# Altium footprint library 4.30-KF-5.08连接器.PcbLib: 147 footprints (part 7 of 10)
Each footprint in its own frame and in the unit in brackets; x right, y up, seen from the top. Pads: shape width x height; smd on the part's side, far side on the other; paste and mask are expansions set on the pad; w line width, h text height; cw(c..) or ccw(c..) is an arc to the next point about the centre after c.
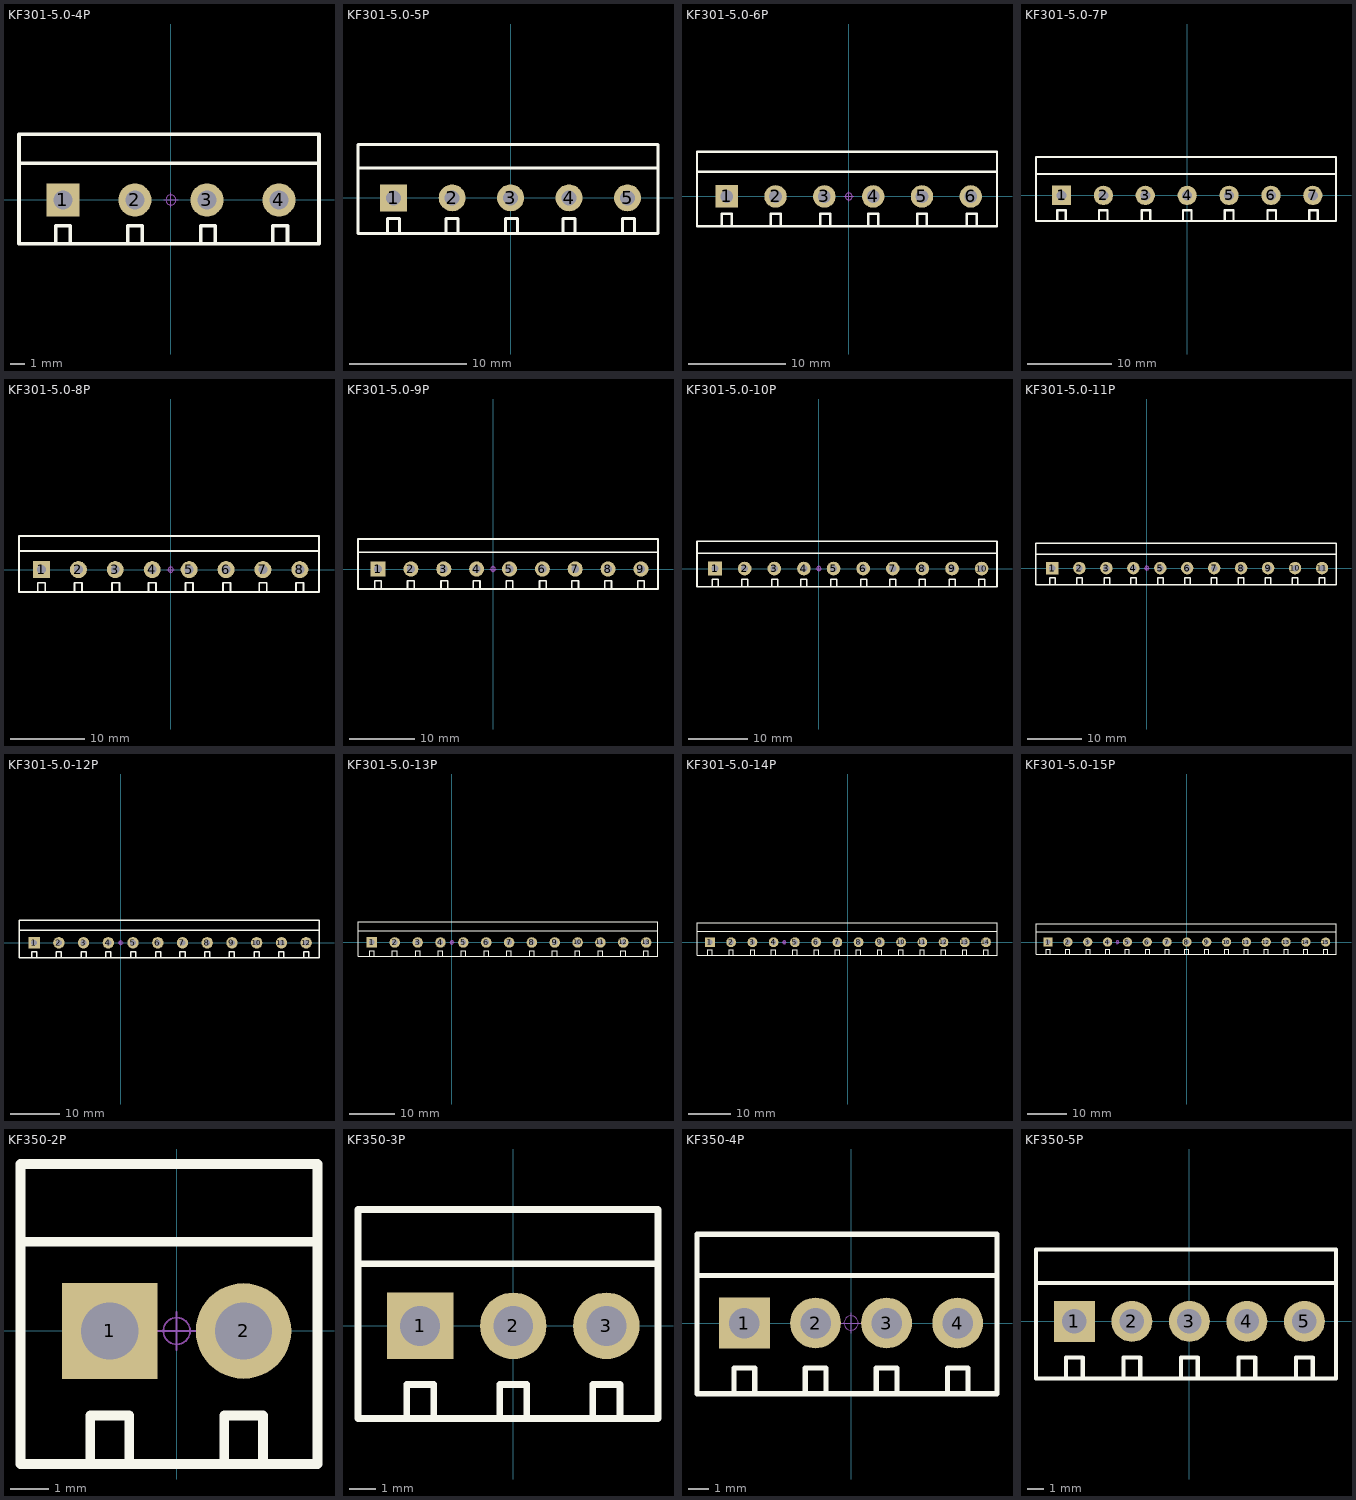
[diagram p6: the footprints below, top view; thin cyan lines are the x and y axes]

## KF301-5.0-4P [mm] "可拼接端子/6A"
pads (4):
  rect 2.3x2.3 hole 1.3: 1(-7.5,0)
  round 2.3 hole 1.3: 2(-2.5,0) 3(2.5,0) 4(7.5,0)
Top Overlay:
  lines w0.254: -10.548,2.54 10.28,2.54 ; -8.008,-3.048 -8.008,-1.778 -6.992,-1.778 -6.992,-3.048 ; -3.008,-3.048 -3.008,-1.778 -1.992,-1.778 -1.992,-3.048 ; 2.072,-3.048 2.072,-1.778 3.088,-1.778 3.088,-3.048 ; 7.072,-3.048 7.072,-1.778 8.088,-1.778 8.088,-3.048 ; -10.548,-3.048 -10.548,4.572 10.28,4.572 10.28,-3.048 -10.548,-3.048
Mechanical 15:
  circle w0.05: c0,0 r0.35
  lines w0.05: -0.5,0 0.5,0 ; 0,-0.5 0,0.5
3D body: height 3.29, standoff -10.51, extent -10.45,-3 -4.95,4.6
3D body: height 3.29, standoff -10.51, extent -5.45,-3 0.05,4.6
3D body: height 3.29, standoff -10.51, extent -0.45,-3 5.05,4.6
3D body: height 3.29, standoff -10.51, extent 4.55,-3 10.05,4.6

## KF301-5.0-5P [mm] "可拼接端子/6A"
pads (5):
  rect 2.3x2.3 hole 1.3: 1(-10,0)
  round 2.3 hole 1.3: 2(-5,0) 3(0,0) 4(5,0) 5(10,0)
Top Overlay:
  lines w0.254: -13.048,2.54 12.606,2.54 ; -10.508,-3.048 -10.508,-1.778 -9.492,-1.778 -9.492,-3.048 ; -5.508,-3.048 -5.508,-1.778 -4.492,-1.778 -4.492,-3.048 ; -0.428,-3.048 -0.428,-1.778 0.588,-1.778 0.588,-3.048 ; 4.492,-3.048 4.492,-1.778 5.508,-1.778 5.508,-3.048 ; 9.572,-3.048 9.572,-1.778 10.588,-1.778 10.588,-3.048 ; -13.048,-3.048 12.606,-3.048 12.606,4.572 -13.048,4.572 -13.048,-3.048
Mechanical 15:
  circle w0.05: c0,0 r0.35
  lines w0.05: -0.5,0 0.5,0 ; 0,-0.5 0,0.5
3D body: height 3.29, standoff -10.51, extent 7.05,-3 12.55,4.6
3D body: height 3.29, standoff -10.51, extent 2.05,-3 7.55,4.6
3D body: height 3.29, standoff -10.51, extent -2.95,-3 2.55,4.6
3D body: height 3.29, standoff -10.51, extent -7.95,-3 -2.45,4.6
3D body: height 3.29, standoff -10.51, extent -12.95,-3 -7.45,4.6

## KF301-5.0-6P [mm] "可拼接端子/6A"
pads (6):
  rect 2.3x2.3 hole 1.3: 1(-12.5,0)
  round 2.3 hole 1.3: 2(-7.5,0) 3(-2.5,0) 4(2.5,0) 5(7.5,0) 6(12.5,0)
Top Overlay:
  lines w0.254: -15.548,2.54 15.186,2.54 ; -13.008,-3.048 -13.008,-1.778 -11.992,-1.778 -11.992,-3.048 ; -8.008,-3.048 -8.008,-1.778 -6.992,-1.778 -6.992,-3.048 ; -2.928,-3.048 -2.928,-1.778 -1.912,-1.778 -1.912,-3.048 ; 1.992,-3.048 1.992,-1.778 3.008,-1.778 3.008,-3.048 ; 6.992,-3.048 6.992,-1.778 8.008,-1.778 8.008,-3.048 ; 12.072,-3.048 12.072,-1.778 13.088,-1.778 13.088,-3.048 ; -15.548,-3.048 15.186,-3.048 15.186,4.572 -15.548,4.572 -15.548,-3.048
Mechanical 15:
  circle w0.05: c0,0 r0.35
  lines w0.05: -0.5,0 0.5,0 ; 0,-0.5 0,0.5
3D body: height 3.29, standoff -10.51, extent -15.45,-3 -9.95,4.6
3D body: height 3.29, standoff -10.51, extent -10.45,-3 -4.95,4.6
3D body: height 3.29, standoff -10.51, extent -5.45,-3 0.05,4.6
3D body: height 3.29, standoff -10.51, extent -0.45,-3 5.05,4.6
3D body: height 3.29, standoff -10.51, extent 4.55,-3 10.05,4.6
3D body: height 3.29, standoff -10.51, extent 9.55,-3 15.05,4.6

## KF301-5.0-7P [mm] "可拼接端子/6A"
pads (7):
  rect 2.3x2.3 hole 1.2: 1(-15,0)
  round 2.3 hole 1.2: 2(-10,0) 3(-5,0) 4(0,0) 5(5,0) 6(10,0) 7(15,0)
Top Overlay:
  lines w0.254: -18.048,2.54 17.766,2.54 ; -15.508,-3.048 -15.508,-1.778 -14.492,-1.778 -14.492,-3.048 ; -10.508,-3.048 -10.508,-1.778 -9.492,-1.778 -9.492,-3.048 ; -5.428,-3.048 -5.428,-1.778 -4.412,-1.778 -4.412,-3.048 ; -0.508,-3.048 -0.508,-1.778 0.508,-1.778 0.508,-3.048 ; 4.492,-3.048 4.492,-1.778 5.508,-1.778 5.508,-3.048 ; 9.572,-3.048 9.572,-1.778 10.588,-1.778 10.588,-3.048 ; 14.572,-3.048 14.572,-1.778 15.588,-1.778 15.588,-3.048 ; -18.048,-3.048 17.766,-3.048 17.766,4.572 -18.048,4.572 -18.048,-3.048
Mechanical 15:
  circle w0.05: c0,0 r0.35
  lines w0.05: -0.5,0 0.5,0 ; 0,-0.5 0,0.5
3D body: height 3.29, standoff -10.51, extent -17.95,-3 -12.45,4.6
3D body: height 3.29, standoff -10.51, extent -12.95,-3 -7.45,4.6
3D body: height 3.29, standoff -10.51, extent -7.95,-3 -2.45,4.6
3D body: height 3.29, standoff -10.51, extent -2.95,-3 2.55,4.6
3D body: height 3.29, standoff -10.51, extent 2.05,-3 7.55,4.6
3D body: height 3.29, standoff -10.51, extent 7.05,-3 12.55,4.6
3D body: height 3.29, standoff -10.51, extent 12.05,-3 17.55,4.6

## KF301-5.0-8P [mm] "可拼接端子/6A"
pads (8):
  rect 2.3x2.3 hole 1.2: 1(-17.5,0)
  round 2.3 hole 1.2: 2(-12.5,0) 3(-7.5,0) 4(-2.5,0) 5(2.5,0) 6(7.5,0) 7(12.5,0) 8(17.5,0)
Top Overlay:
  lines w0.254: -20.548,2.54 20.092,2.54 ; -18.008,-3.048 -18.008,-1.778 -16.992,-1.778 -16.992,-3.048 ; -13.008,-3.048 -13.008,-1.778 -11.992,-1.778 -11.992,-3.048 ; -7.928,-3.048 -7.928,-1.778 -6.912,-1.778 -6.912,-3.048 ; -3.008,-3.048 -3.008,-1.778 -1.992,-1.778 -1.992,-3.048 ; 1.992,-3.048 1.992,-1.778 3.008,-1.778 3.008,-3.048 ; 7.072,-3.048 7.072,-1.778 8.088,-1.778 8.088,-3.048 ; 11.992,-3.048 11.992,-1.778 13.008,-1.778 13.008,-3.048 ; 16.992,-3.048 16.992,-1.778 18.008,-1.778 18.008,-3.048 ; -20.548,-3.048 -20.548,4.572 20.092,4.572 20.092,-3.048 -20.548,-3.048
Mechanical 15:
  circle w0.05: c0,0 r0.35
  lines w0.05: -0.5,0 0.5,0 ; 0,-0.5 0,0.5
3D body: height 3.29, standoff -10.51, extent -20.45,-3 -14.95,4.6
3D body: height 3.29, standoff -10.51, extent -15.45,-3 -9.95,4.6
3D body: height 3.29, standoff -10.51, extent -10.45,-3 -4.95,4.6
3D body: height 3.29, standoff -10.51, extent -5.45,-3 0.05,4.6
3D body: height 3.29, standoff -10.51, extent -0.45,-3 5.05,4.6
3D body: height 3.29, standoff -10.51, extent 4.55,-3 10.05,4.6
3D body: height 3.29, standoff -10.51, extent 9.55,-3 15.05,4.6
3D body: height 3.29, standoff -10.51, extent 14.55,-3 20.05,4.6

## KF301-5.0-9P [mm] "可拼接端子/6A"
pads (9):
  rect 2.3x2.3 hole 1.2: 1(-17.5,0)
  round 2.3 hole 1.2: 2(-12.5,0) 3(-7.5,0) 4(-2.5,0) 5(2.5,0) 6(7.5,0) 7(12.5,0) 8(17.5,0) 9(22.5,0)
Top Overlay:
  lines w0.254: -20.548,2.54 20.092,2.54 25.052,2.54 ; -18.008,-3.048 -18.008,-1.778 -16.992,-1.778 -16.992,-3.048 ; -13.008,-3.048 -13.008,-1.778 -11.992,-1.778 -11.992,-3.048 ; -7.928,-3.048 -7.928,-1.778 -6.912,-1.778 -6.912,-3.048 ; -3.008,-3.048 -3.008,-1.778 -1.992,-1.778 -1.992,-3.048 ; 1.992,-3.048 1.992,-1.778 3.008,-1.778 3.008,-3.048 ; 7.072,-3.048 7.072,-1.778 8.088,-1.778 8.088,-3.048 ; 11.992,-3.048 11.992,-1.778 13.008,-1.778 13.008,-3.048 ; 16.992,-3.048 16.992,-1.778 18.008,-1.778 18.008,-3.048 ; 21.992,-3.048 21.992,-1.778 23.008,-1.778 23.008,-3.048 ; -20.548,-3.048 20.092,-3.048 25.092,-3.048 25.092,4.572 20.092,4.572 -20.548,4.572 -20.548,-3.048
Mechanical 15:
  circle w0.05: c0,0 r0.35
  lines w0.05: -0.5,0 0.5,0 ; 0,-0.5 0,0.5
3D body: height 3.29, standoff -10.51, extent -20.45,-3 -14.95,4.6
3D body: height 3.29, standoff -10.51, extent -15.45,-3 -9.95,4.6
3D body: height 3.29, standoff -10.51, extent -10.45,-3 -4.95,4.6
3D body: height 3.29, standoff -10.51, extent -5.45,-3 0.05,4.6
3D body: height 3.29, standoff -10.51, extent -0.45,-3 5.05,4.6
3D body: height 3.29, standoff -10.51, extent 4.55,-3 10.05,4.6
3D body: height 3.29, standoff -10.51, extent 9.55,-3 15.05,4.6
3D body: height 3.29, standoff -10.51, extent 14.55,-3 20.05,4.6
3D body: height 3.29, standoff -10.51, extent 19.55,-3 25.05,4.6

## KF301-5.0-10P [mm] "可拼接端子/6A"
pads (10):
  rect 2.3x2.3 hole 1.2: 1(-17.5,0)
  round 2.3 hole 1.2: 2(-12.5,0) 3(-7.5,0) 4(-2.5,0) 5(2.5,0) 6(7.5,0) 7(12.5,0) 8(17.5,0) 9(22.5,0) 10(27.5,0)
Top Overlay:
  lines w0.254: -20.548,2.54 20.092,2.54 25.052,2.54 ; -18.008,-3.048 -18.008,-1.778 -16.992,-1.778 -16.992,-3.048 ; -13.008,-3.048 -13.008,-1.778 -11.992,-1.778 -11.992,-3.048 ; -7.928,-3.048 -7.928,-1.778 -6.912,-1.778 -6.912,-3.048 ; -3.008,-3.048 -3.008,-1.778 -1.992,-1.778 -1.992,-3.048 ; 1.992,-3.048 1.992,-1.778 3.008,-1.778 3.008,-3.048 ; 7.072,-3.048 7.072,-1.778 8.088,-1.778 8.088,-3.048 ; 11.992,-3.048 11.992,-1.778 13.008,-1.778 13.008,-3.048 ; 16.992,-3.048 16.992,-1.778 18.008,-1.778 18.008,-3.048 ; 21.992,-3.048 21.992,-1.778 23.008,-1.778 23.008,-3.048 ; 25.092,2.54 30.052,2.54 ; 26.992,-3.048 26.992,-1.778 28.008,-1.778 28.008,-3.048 ; -20.548,-3.048 20.092,-3.048 25.092,-3.048 30.092,-3.048 30.092,4.572 25.092,4.572 20.092,4.572 -20.548,4.572 -20.548,-3.048
Mechanical 15:
  circle w0.05: c0,0 r0.35
  lines w0.05: -0.5,0 0.5,0 ; 0,-0.5 0,0.5
3D body: height 3.29, standoff -10.51, extent -20.45,-3 -14.95,4.6
3D body: height 3.29, standoff -10.51, extent -15.45,-3 -9.95,4.6
3D body: height 3.29, standoff -10.51, extent -10.45,-3 -4.95,4.6
3D body: height 3.29, standoff -10.51, extent -5.45,-3 0.05,4.6
3D body: height 3.29, standoff -10.51, extent -0.45,-3 5.05,4.6
3D body: height 3.29, standoff -10.51, extent 4.55,-3 10.05,4.6
3D body: height 3.29, standoff -10.51, extent 9.55,-3 15.05,4.6
3D body: height 3.29, standoff -10.51, extent 14.55,-3 20.05,4.6
3D body: height 3.29, standoff -10.51, extent 19.55,-3 25.05,4.6
3D body: height 3.29, standoff -10.51, extent 24.55,-3 30.05,4.6

## KF301-5.0-11P [mm] "可拼接端子/6A"
pads (11):
  rect 2.3x2.3 hole 1.2: 1(-17.5,0)
  round 2.3 hole 1.2: 2(-12.5,0) 3(-7.5,0) 4(-2.5,0) 5(2.5,0) 6(7.5,0) 7(12.5,0) 8(17.5,0) 9(22.5,0) 10(27.5,0) 11(32.5,0)
Top Overlay:
  lines w0.254: -20.548,2.54 20.092,2.54 25.052,2.54 ; -18.008,-3.048 -18.008,-1.778 -16.992,-1.778 -16.992,-3.048 ; -13.008,-3.048 -13.008,-1.778 -11.992,-1.778 -11.992,-3.048 ; -7.928,-3.048 -7.928,-1.778 -6.912,-1.778 -6.912,-3.048 ; -3.008,-3.048 -3.008,-1.778 -1.992,-1.778 -1.992,-3.048 ; 1.992,-3.048 1.992,-1.778 3.008,-1.778 3.008,-3.048 ; 7.072,-3.048 7.072,-1.778 8.088,-1.778 8.088,-3.048 ; 11.992,-3.048 11.992,-1.778 13.008,-1.778 13.008,-3.048 ; 16.992,-3.048 16.992,-1.778 18.008,-1.778 18.008,-3.048 ; 21.992,-3.048 21.992,-1.778 23.008,-1.778 23.008,-3.048 ; 25.092,2.54 30.052,2.54 ; 26.992,-3.048 26.992,-1.778 28.008,-1.778 28.008,-3.048 ; 30.092,2.54 35.052,2.54 ; 31.992,-3.048 31.992,-1.778 33.008,-1.778 33.008,-3.048 ; -20.548,-3.048 20.092,-3.048 25.092,-3.048 30.092,-3.048 35.092,-3.048 35.092,4.572 30.092,4.572 25.092,4.572 20.092,4.572 -20.548,4.572 -20.548,-3.048
Mechanical 15:
  circle w0.05: c0,0 r0.35
  lines w0.05: -0.5,0 0.5,0 ; 0,-0.5 0,0.5
3D body: height 3.29, standoff -10.51, extent -20.45,-3 -14.95,4.6
3D body: height 3.29, standoff -10.51, extent -15.45,-3 -9.95,4.6
3D body: height 3.29, standoff -10.51, extent -10.45,-3 -4.95,4.6
3D body: height 3.29, standoff -10.51, extent -5.45,-3 0.05,4.6
3D body: height 3.29, standoff -10.51, extent -0.45,-3 5.05,4.6
3D body: height 3.29, standoff -10.51, extent 4.55,-3 10.05,4.6
3D body: height 3.29, standoff -10.51, extent 9.55,-3 15.05,4.6
3D body: height 3.29, standoff -10.51, extent 14.55,-3 20.05,4.6
3D body: height 3.29, standoff -10.51, extent 19.55,-3 25.05,4.6
3D body: height 3.29, standoff -10.51, extent 24.55,-3 30.05,4.6
3D body: height 3.29, standoff -10.51, extent 29.55,-3 35.05,4.6

## KF301-5.0-12P [mm] "可拼接端子/6A"
pads (12):
  rect 2.3x2.3 hole 1.2: 1(-17.5,0)
  round 2.3 hole 1.2: 2(-12.5,0) 3(-7.5,0) 4(-2.5,0) 5(2.5,0) 6(7.5,0) 7(12.5,0) 8(17.5,0) 9(22.5,0) 10(27.5,0) 11(32.5,0) 12(37.5,0)
Top Overlay:
  lines w0.254: -20.548,2.54 20.092,2.54 25.052,2.54 ; -18.008,-3.048 -18.008,-1.778 -16.992,-1.778 -16.992,-3.048 ; -13.008,-3.048 -13.008,-1.778 -11.992,-1.778 -11.992,-3.048 ; -7.928,-3.048 -7.928,-1.778 -6.912,-1.778 -6.912,-3.048 ; -3.008,-3.048 -3.008,-1.778 -1.992,-1.778 -1.992,-3.048 ; 1.992,-3.048 1.992,-1.778 3.008,-1.778 3.008,-3.048 ; 7.072,-3.048 7.072,-1.778 8.088,-1.778 8.088,-3.048 ; 11.992,-3.048 11.992,-1.778 13.008,-1.778 13.008,-3.048 ; 16.992,-3.048 16.992,-1.778 18.008,-1.778 18.008,-3.048 ; 21.992,-3.048 21.992,-1.778 23.008,-1.778 23.008,-3.048 ; 25.092,2.54 30.052,2.54 ; 26.992,-3.048 26.992,-1.778 28.008,-1.778 28.008,-3.048 ; 30.092,2.54 35.052,2.54 ; 31.992,-3.048 31.992,-1.778 33.008,-1.778 33.008,-3.048 ; 35.092,2.54 40.052,2.54 ; 36.992,-3.048 36.992,-1.778 38.008,-1.778 38.008,-3.048 ; -20.548,-3.048 -20.548,4.572 20.092,4.572 25.092,4.572 30.092,4.572 35.092,4.572 40.092,4.572 40.092,-3.048 35.092,-3.048 30.092,-3.048 25.092,-3.048 20.092,-3.048 -20.548,-3.048
Mechanical 15:
  circle w0.05: c0,0 r0.35
  lines w0.05: -0.5,0 0.5,0 ; 0,-0.5 0,0.5
3D body: height 3.29, standoff -10.51, extent -20.45,-3 -14.95,4.6
3D body: height 3.29, standoff -10.51, extent -15.45,-3 -9.95,4.6
3D body: height 3.29, standoff -10.51, extent -10.45,-3 -4.95,4.6
3D body: height 3.29, standoff -10.51, extent -5.45,-3 0.05,4.6
3D body: height 3.29, standoff -10.51, extent -0.45,-3 5.05,4.6
3D body: height 3.29, standoff -10.51, extent 4.55,-3 10.05,4.6
3D body: height 3.29, standoff -10.51, extent 9.55,-3 15.05,4.6
3D body: height 3.29, standoff -10.51, extent 14.55,-3 20.05,4.6
3D body: height 3.29, standoff -10.51, extent 19.55,-3 25.05,4.6
3D body: height 3.29, standoff -10.51, extent 24.55,-3 30.05,4.6
3D body: height 3.29, standoff -10.51, extent 29.55,-3 35.05,4.6
3D body: height 3.29, standoff -10.51, extent 34.55,-3 40.05,4.6

## KF301-5.0-13P [mm] "可拼接端子/6A"
pads (13):
  rect 2.3x2.3 hole 1.2: 1(-17.5,0)
  round 2.3 hole 1.2: 2(-12.5,0) 3(-7.5,0) 4(-2.5,0) 5(2.5,0) 6(7.5,0) 7(12.5,0) 8(17.5,0) 9(22.5,0) 10(27.5,0) 11(32.5,0) 12(37.5,0) 13(42.5,0)
Top Overlay:
  lines w0.254: -20.548,2.54 20.092,2.54 25.052,2.54 ; -18.008,-3.048 -18.008,-1.778 -16.992,-1.778 -16.992,-3.048 ; -13.008,-3.048 -13.008,-1.778 -11.992,-1.778 -11.992,-3.048 ; -7.928,-3.048 -7.928,-1.778 -6.912,-1.778 -6.912,-3.048 ; -3.008,-3.048 -3.008,-1.778 -1.992,-1.778 -1.992,-3.048 ; 1.992,-3.048 1.992,-1.778 3.008,-1.778 3.008,-3.048 ; 7.072,-3.048 7.072,-1.778 8.088,-1.778 8.088,-3.048 ; 11.992,-3.048 11.992,-1.778 13.008,-1.778 13.008,-3.048 ; 16.992,-3.048 16.992,-1.778 18.008,-1.778 18.008,-3.048 ; 21.992,-3.048 21.992,-1.778 23.008,-1.778 23.008,-3.048 ; 25.092,2.54 30.052,2.54 ; 26.992,-3.048 26.992,-1.778 28.008,-1.778 28.008,-3.048 ; 30.092,2.54 35.052,2.54 ; 31.992,-3.048 31.992,-1.778 33.008,-1.778 33.008,-3.048 ; 35.092,2.54 40.052,2.54 ; 36.992,-3.048 36.992,-1.778 38.008,-1.778 38.008,-3.048 ; 40.092,2.54 45.052,2.54 ; 41.992,-3.048 41.992,-1.778 43.008,-1.778 43.008,-3.048 ; -20.548,-3.048 -20.548,4.572 20.092,4.572 25.092,4.572 30.092,4.572 35.092,4.572 40.092,4.572 45.092,4.572 45.092,-3.048 40.092,-3.048 35.092,-3.048 30.092,-3.048 25.092,-3.048 20.092,-3.048 -20.548,-3.048
Mechanical 15:
  circle w0.05: c0,0 r0.35
  lines w0.05: -0.5,0 0.5,0 ; 0,-0.5 0,0.5
3D body: height 3.29, standoff -10.51, extent 39.55,-3 45.05,4.6
3D body: height 3.29, standoff -10.51, extent 34.55,-3 40.05,4.6
3D body: height 3.29, standoff -10.51, extent 29.55,-3 35.05,4.6
3D body: height 3.29, standoff -10.51, extent 24.55,-3 30.05,4.6
3D body: height 3.29, standoff -10.51, extent 19.55,-3 25.05,4.6
3D body: height 3.29, standoff -10.51, extent 14.55,-3 20.05,4.6
3D body: height 3.29, standoff -10.51, extent 9.55,-3 15.05,4.6
3D body: height 3.29, standoff -10.51, extent 4.55,-3 10.05,4.6
3D body: height 3.29, standoff -10.51, extent -0.45,-3 5.05,4.6
3D body: height 3.29, standoff -10.51, extent -5.45,-3 0.05,4.6
3D body: height 3.29, standoff -10.51, extent -10.45,-3 -4.95,4.6
3D body: height 3.29, standoff -10.51, extent -15.45,-3 -9.95,4.6
3D body: height 3.29, standoff -10.51, extent -20.45,-3 -14.95,4.6

## KF301-5.0-14P [mm] "可拼接端子/6A"
pads (14):
  rect 2.3x2.3 hole 1.2: 1(-32.5,0)
  round 2.3 hole 1.2: 2(-27.5,0) 3(-22.5,0) 4(-17.5,0) 5(-12.5,0) 6(-7.5,0) 7(-2.5,0) 8(2.5,0) 9(7.5,0) 10(12.5,0) 11(17.5,0) 12(22.5,0) 13(27.5,0) 14(32.5,0)
Top Overlay:
  lines w0.254: -35.548,2.54 5.092,2.54 10.052,2.54 ; -33.008,-3.048 -33.008,-1.778 -31.992,-1.778 -31.992,-3.048 ; -28.008,-3.048 -28.008,-1.778 -26.992,-1.778 -26.992,-3.048 ; -22.928,-3.048 -22.928,-1.778 -21.912,-1.778 -21.912,-3.048 ; -18.008,-3.048 -18.008,-1.778 -16.992,-1.778 -16.992,-3.048 ; -13.008,-3.048 -13.008,-1.778 -11.992,-1.778 -11.992,-3.048 ; -7.928,-3.048 -7.928,-1.778 -6.912,-1.778 -6.912,-3.048 ; -3.008,-3.048 -3.008,-1.778 -1.992,-1.778 -1.992,-3.048 ; 1.992,-3.048 1.992,-1.778 3.008,-1.778 3.008,-3.048 ; 6.992,-3.048 6.992,-1.778 8.008,-1.778 8.008,-3.048 ; 10.092,2.54 15.052,2.54 ; 11.992,-3.048 11.992,-1.778 13.008,-1.778 13.008,-3.048 ; 15.092,2.54 20.052,2.54 ; 16.992,-3.048 16.992,-1.778 18.008,-1.778 18.008,-3.048 ; 20.092,2.54 25.052,2.54 ; 21.992,-3.048 21.992,-1.778 23.008,-1.778 23.008,-3.048 ; 25.092,2.54 30.052,2.54 ; 26.992,-3.048 26.992,-1.778 28.008,-1.778 28.008,-3.048 ; 30.092,2.54 35.052,2.54 ; 31.992,-3.048 31.992,-1.778 33.008,-1.778 33.008,-3.048 ; -35.548,-3.048 -35.548,4.572 5.092,4.572 10.092,4.572 15.092,4.572 20.092,4.572 25.092,4.572 30.092,4.572 35.092,4.572 35.092,-3.048 30.092,-3.048 25.092,-3.048 20.092,-3.048 15.092,-3.048 10.092,-3.048 5.092,-3.048 -35.548,-3.048
Mechanical 15:
  circle w0.05: c-15,0 r0.35
  lines w0.05: -15.5,0 -14.5,0 ; -15,-0.5 -15,0.5
3D body: height 3.29, standoff -10.51, extent -35.45,-3 -29.95,4.6
3D body: height 3.29, standoff -10.51, extent -30.45,-3 -24.95,4.6
3D body: height 3.29, standoff -10.51, extent -25.45,-3 -19.95,4.6
3D body: height 3.29, standoff -10.51, extent -20.45,-3 -14.95,4.6
3D body: height 3.29, standoff -10.51, extent -15.45,-3 -9.95,4.6
3D body: height 3.29, standoff -10.51, extent -10.45,-3 -4.95,4.6
3D body: height 3.29, standoff -10.51, extent -5.45,-3 0.05,4.6
3D body: height 3.29, standoff -10.51, extent -0.45,-3 5.05,4.6
3D body: height 3.29, standoff -10.51, extent 4.55,-3 10.05,4.6
3D body: height 3.29, standoff -10.51, extent 9.55,-3 15.05,4.6
3D body: height 3.29, standoff -10.51, extent 14.55,-3 20.05,4.6
3D body: height 3.29, standoff -10.51, extent 19.55,-3 25.05,4.6
3D body: height 3.29, standoff -10.51, extent 24.55,-3 30.05,4.6
3D body: height 3.29, standoff -10.51, extent 29.55,-3 35.05,4.6

## KF301-5.0-15P [mm] "可拼接端子/6A"
pads (15):
  rect 2.3x2.3 hole 1.2: 1(-35,0)
  round 2.3 hole 1.2: 2(-30,0) 3(-25,0) 4(-20,0) 5(-15,0) 6(-10,0) 7(-5,0) 8(0,0) 9(5,0) 10(10,0) 11(15,0) 12(20,0) 13(25,0) 14(30,0) 15(35,0)
Top Overlay:
  lines w0.254: -38.048,2.54 2.592,2.54 7.552,2.54 ; -35.508,-3.048 -35.508,-1.778 -34.492,-1.778 -34.492,-3.048 ; -30.508,-3.048 -30.508,-1.778 -29.492,-1.778 -29.492,-3.048 ; -25.428,-3.048 -25.428,-1.778 -24.412,-1.778 -24.412,-3.048 ; -20.508,-3.048 -20.508,-1.778 -19.492,-1.778 -19.492,-3.048 ; -15.508,-3.048 -15.508,-1.778 -14.492,-1.778 -14.492,-3.048 ; -10.428,-3.048 -10.428,-1.778 -9.412,-1.778 -9.412,-3.048 ; -5.508,-3.048 -5.508,-1.778 -4.492,-1.778 -4.492,-3.048 ; -0.508,-3.048 -0.508,-1.778 0.508,-1.778 0.508,-3.048 ; 4.492,-3.048 4.492,-1.778 5.508,-1.778 5.508,-3.048 ; 7.592,2.54 12.552,2.54 ; 9.492,-3.048 9.492,-1.778 10.508,-1.778 10.508,-3.048 ; 12.592,2.54 17.552,2.54 ; 14.492,-3.048 14.492,-1.778 15.508,-1.778 15.508,-3.048 ; 17.592,2.54 22.552,2.54 ; 19.492,-3.048 19.492,-1.778 20.508,-1.778 20.508,-3.048 ; 22.592,2.54 27.552,2.54 ; 24.492,-3.048 24.492,-1.778 25.508,-1.778 25.508,-3.048 ; 27.592,2.54 32.552,2.54 ; 29.492,-3.048 29.492,-1.778 30.508,-1.778 30.508,-3.048 ; 32.592,2.54 37.552,2.54 ; 34.492,-3.048 34.492,-1.778 35.508,-1.778 35.508,-3.048 ; -38.048,-3.048 2.592,-3.048 7.592,-3.048 12.592,-3.048 17.592,-3.048 22.592,-3.048 27.592,-3.048 32.592,-3.048 37.592,-3.048 37.592,4.572 32.592,4.572 27.592,4.572 22.592,4.572 17.592,4.572 12.592,4.572 7.592,4.572 2.592,4.572 -38.048,4.572 -38.048,-3.048
Mechanical 15:
  circle w0.05: c-17.5,0 r0.35
  lines w0.05: -18,0 -17,0 ; -17.5,-0.5 -17.5,0.5
3D body: height 3.29, standoff -10.51, extent -37.95,-3 -32.45,4.6
3D body: height 3.29, standoff -10.51, extent -32.95,-3 -27.45,4.6
3D body: height 3.29, standoff -10.51, extent -27.95,-3 -22.45,4.6
3D body: height 3.29, standoff -10.51, extent -22.95,-3 -17.45,4.6
3D body: height 3.29, standoff -10.51, extent -17.95,-3 -12.45,4.6
3D body: height 3.29, standoff -10.51, extent -12.95,-3 -7.45,4.6
3D body: height 3.29, standoff -10.51, extent -7.95,-3 -2.45,4.6
3D body: height 3.29, standoff -10.51, extent -2.95,-3 2.55,4.6
3D body: height 3.29, standoff -10.51, extent 2.05,-3 7.55,4.6
3D body: height 3.29, standoff -10.51, extent 7.05,-3 12.55,4.6
3D body: height 3.29, standoff -10.51, extent 12.05,-3 17.55,4.6
3D body: height 3.29, standoff -10.51, extent 17.05,-3 22.55,4.6
3D body: height 3.29, standoff -10.51, extent 22.05,-3 27.55,4.6
3D body: height 3.29, standoff -10.51, extent 27.05,-3 32.55,4.6
3D body: height 3.29, standoff -10.51, extent 32.05,-3 37.55,4.6

## KF350-2P [mm] "可拼接端子/10A"
pads (2):
  rect 2.5x2.5 hole 1.5: 1(-1.75,0)
  round 2.5 hole 1.5: 2(1.75,0)
Top Overlay:
  lines w0.254: -4.087,2.337 3.686,2.337 ; -2.258,-3.48 -2.258,-2.21 -1.242,-2.21 -1.242,-3.48 ; 1.242,-3.48 1.242,-2.21 2.258,-2.21 2.258,-3.48 ; -4.087,-3.48 -4.087,4.369 3.686,4.369 3.686,-3.48 -4.087,-3.48
Mechanical 15:
  circle w0.05: c0,0 r0.35
  lines w0.05: -0.5,0 0.5,0 ; 0,-0.5 0,0.5
3D body: height 10.1, standoff -3.7, extent -0.4,-3.3 3.5,4.2
3D body: height 10.1, standoff -3.7, extent -3.9,-3.3 0,4.2

## KF350-3P [mm] "可拼接端子/10A"
pads (3):
  rect 2.5x2.5 hole 1.5: 1(-3.5,0)
  round 2.5 hole 1.5: 2(0,0) 3(3.5,0)
Top Overlay:
  lines w0.254: -5.837,2.337 5.441,2.337 ; -4.008,-3.48 -4.008,-2.21 -2.992,-2.21 -2.992,-3.48 ; -0.508,-3.48 -0.508,-2.21 0.508,-2.21 0.508,-3.48 ; 2.992,-3.48 2.992,-2.21 4.008,-2.21 4.008,-3.48 ; -5.837,-3.48 5.441,-3.48 5.441,4.369 -5.837,4.369 -5.837,-3.48
Mechanical 15:
  circle w0.05: c0,0 r0.35
  lines w0.05: -0.5,0 0.5,0 ; 0,-0.5 0,0.5
3D body: height 10.1, standoff -3.7, extent -5.65,-3.3 -1.75,4.2
3D body: height 10.1, standoff -3.7, extent -2.15,-3.3 1.75,4.2
3D body: height 10.1, standoff -3.7, extent 1.35,-3.3 5.25,4.2

## KF350-4P [mm] "可拼接端子/10A"
pads (4):
  rect 2.5x2.5 hole 1.5: 1(-5.25,0)
  round 2.5 hole 1.5: 2(-1.75,0) 3(1.75,0) 4(5.25,0)
Top Overlay:
  lines w0.254: -7.587,2.337 7.186,2.337 ; -5.758,-3.48 -5.758,-2.21 -4.742,-2.21 -4.742,-3.48 ; -2.258,-3.48 -2.258,-2.21 -1.242,-2.21 -1.242,-3.48 ; 1.242,-3.48 1.242,-2.21 2.258,-2.21 2.258,-3.48 ; 4.742,-3.48 4.742,-2.21 5.758,-2.21 5.758,-3.48 ; -7.587,-3.48 -7.587,4.369 7.186,4.369 7.186,-3.48 -7.587,-3.48
Mechanical 15:
  circle w0.05: c0,0 r0.35
  lines w0.05: -0.5,0 0.5,0 ; 0,-0.5 0,0.5
3D body: height 10.1, standoff -3.7, extent 3.1,-3.3 7,4.2
3D body: height 10.1, standoff -3.7, extent -0.4,-3.3 3.5,4.2
3D body: height 10.1, standoff -3.7, extent -3.9,-3.3 0,4.2
3D body: height 10.1, standoff -3.7, extent -7.4,-3.3 -3.5,4.2

## KF350-5P [mm] "可拼接端子/10A"
pads (5):
  rect 2.5x2.5 hole 1.5: 1(-7,0)
  round 2.5 hole 1.5: 2(-3.5,0) 3(0,0) 4(3.5,0) 5(7,0)
Top Overlay:
  lines w0.254: -9.337,2.337 8.926,2.337 ; -7.508,-3.48 -7.508,-2.21 -6.492,-2.21 -6.492,-3.48 ; -4.008,-3.48 -4.008,-2.21 -2.992,-2.21 -2.992,-3.48 ; -0.508,-3.48 -0.508,-2.21 0.508,-2.21 0.508,-3.48 ; 2.992,-3.48 2.992,-2.21 4.008,-2.21 4.008,-3.48 ; 6.492,-3.48 6.492,-2.21 7.508,-2.21 7.508,-3.48 ; -9.337,-3.48 -9.337,4.369 8.926,4.369 8.926,-3.48 -9.337,-3.48
Mechanical 15:
  circle w0.05: c0,0 r0.35
  lines w0.05: -0.5,0 0.5,0 ; 0,-0.5 0,0.5
3D body: height 10.1, standoff -3.7, extent -9.15,-3.3 -5.25,4.2
3D body: height 10.1, standoff -3.7, extent -5.65,-3.3 -1.75,4.2
3D body: height 10.1, standoff -3.7, extent -2.15,-3.3 1.75,4.2
3D body: height 10.1, standoff -3.7, extent 1.35,-3.3 5.25,4.2
3D body: height 10.1, standoff -3.7, extent 4.85,-3.3 8.75,4.2